# Altium footprint library UZ_CarrierBoard.PcbLib: 91 footprints (part 3 of 6)
Each footprint in its own frame and in the unit in brackets; x right, y up, seen from the top. Pads: shape width x height; smd on the part's side, far side on the other; paste and mask are expansions set on the pad; w line width, h text height; cw(c..) or ccw(c..) is an arc to the next point about the centre after c.
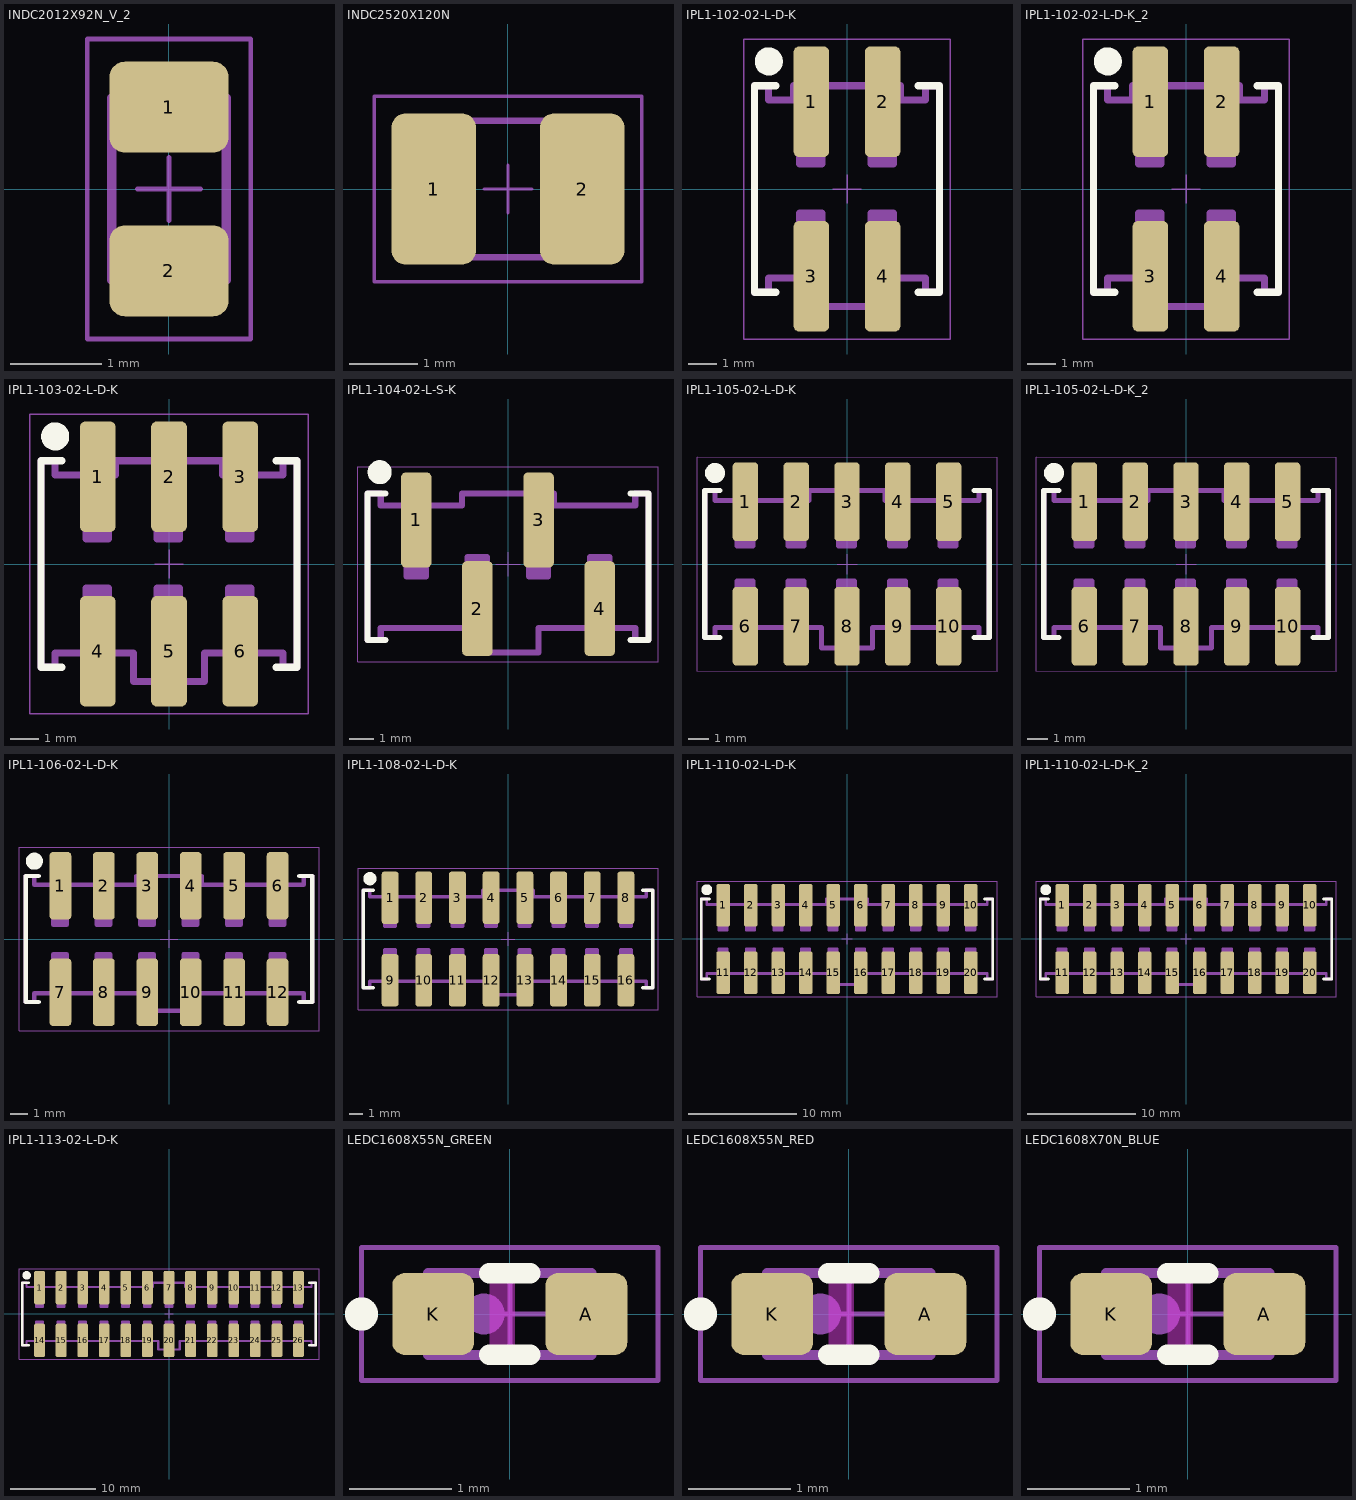
[diagram p2: the footprints below, top view; thin cyan lines are the x and y axes]

## INDC2012X92N_V_2 [mm]
pads (2):
  rrect33% 1.31x1 smd: 1(0,0.9) 2(0,-0.9)
Mechanical 13:
  lines w0.1: -0.625,-0.6 0.63,-0.6 ; -0.625,0.6 0.625,0.6 ; -0.63,-1 -0.63,1 0.63,1 0.63,-1 -0.63,-1
  text ".Designator" at 0.867,0.644 h0.7
Mechanical 15:
  lines w0.05: -0.35,0 0.35,0 ; 0,-0.35 0,0.35 ; -0.9,-1.65 -0.9,1.65 0.9,1.65 0.9,-1.65 -0.9,-1.65
3D body "742792040_Download_STP_WE-CBF-0805_rev1.stp": height 0.91, standoff 0.01, extent -0.6,-1 0.6,1

## INDC2520X120N [mm]
pads (2):
  rrect33% 1.24x2.22 smd: 1(-1.09,0) 2(1.09,0)
Mechanical 13:
  lines w0.1: -0.65,-1 -0.65,1 ; 0.65,-1 0.65,1 ; -1.25,-1 -1.25,1 1.25,1 1.25,-1 -1.25,-1
  text ".Designator" at -2.8,0.7 h1
Mechanical 15:
  lines w0.05: -0.35,0 0.35,0 ; 0,-0.35 0,0.35 ; -1.96,-1.36 -1.96,1.36 1.96,1.36 1.96,-1.36 -1.96,-1.36
3D body "LQM2HP_J0.stp": height 1.1, standoff 0, extent -1.25,-1 1.25,1

## IPL1-102-02-L-D-K [mil]
pads (4):
  rrect30% 50x155 smd mask+2: 1(-50,122.5) 2(50,122.5) 3(-50,-122.5) 4(50,-122.5)
Top Overlay:
  circle w19.68: c-109.84,179.13 r9.84
  lines w10: -100,-145 -130,-145 -130,145 -100,145 ; 100,-145 130,-145 130,145 100,145
Mechanical 13:
  rectangle: -66.53,35.03 -35.04,66.53
  rectangle: 33.46,35.04 64.95,66.53
  rectangle: -66.53,-64.96 -35.04,-33.46
  rectangle: 33.46,-64.96 64.96,-33.46
  lines w10: -130,-145 -110,-145 ; -130,-145 -130,145 ; -130,-145 -110,-145 ; -130,145 -110,145 ; -130,145 -110,145 ; -110,-145 -110,-125 ; -110,-145 -110,-125 ; -110,-125 -50,-125 -50,-165 50,-165 50,-125 110,-125 ; -110,125 -75,125 -75,145 75,145 75,125 110,125 ; -110,125 -110,145 ; -110,125 -110,145 ; 110,-145 110,-125 ; 110,-145 130,-145 ; 110,-145 110,-125 ; 110,-145 130,-145 ; 110,125 110,145 ; 110,125 110,145 ; 110,145 130,145 ; 110,145 130,145 ; 130,-145 130,145 ; -66.54,-64.96 -35.04,-64.96 -35.04,-33.46 -66.54,-33.46 -66.54,-64.96 ; -66.54,35.04 -35.04,35.04 -35.04,66.54 -66.54,66.54 -66.54,35.04 ; 33.46,-64.96 64.96,-64.96 64.96,-33.46 33.46,-33.46 33.46,-64.96 ; 33.46,35.04 64.96,35.04 64.96,66.54 33.46,66.54 33.46,35.04
  text ".Designator" at 20.87,-43.31 h39.37
  text "1" at -107.48,74.8 h27.56
  text "3" at -109.45,-108.27 h27.56
  text "4" at 80.31,-106.75 h27.56
  text "2" at 82.28,76.32 h27.56
Mechanical 15:
  lines w1.97: -19.68,0 19.69,0 ; 0,-19.69 0,19.68 ; -145.28,-210.63 145.28,-210.63 145.28,210.63 -145.28,210.63 -145.28,-210.63
3D body "IPL1-102-02-L-D-K.stp": height 345.5, standoff 0.5, extent -129.99,-188.5 130.01,188.5

## IPL1-102-02-L-D-K_2 [mil]
pads (4):
  rrect30% 50x155 smd mask+2: 1(-50,122.5) 2(50,122.5) 3(-50,-122.5) 4(50,-122.5)
Top Overlay:
  circle w19.68: c-109.84,179.13 r9.84
  lines w10: -100,-145 -130,-145 -130,145 -100,145 ; 100,-145 130,-145 130,145 100,145
Mechanical 13:
  rectangle: -66.53,35.03 -35.04,66.53
  rectangle: 33.46,35.04 64.95,66.53
  rectangle: -66.53,-64.96 -35.04,-33.46
  rectangle: 33.46,-64.96 64.96,-33.46
  lines w10: -130,-145 -110,-145 ; -130,-145 -130,145 ; -130,-145 -110,-145 ; -130,145 -110,145 ; -130,145 -110,145 ; -110,-145 -110,-125 ; -110,-145 -110,-125 ; -110,-125 -50,-125 -50,-165 50,-165 50,-125 110,-125 ; -110,125 -75,125 -75,145 75,145 75,125 110,125 ; -110,125 -110,145 ; -110,125 -110,145 ; 110,-145 110,-125 ; 110,-145 130,-145 ; 110,-145 110,-125 ; 110,-145 130,-145 ; 110,125 110,145 ; 110,125 110,145 ; 110,145 130,145 ; 110,145 130,145 ; 130,-145 130,145 ; -66.54,-64.96 -35.04,-64.96 -35.04,-33.46 -66.54,-33.46 -66.54,-64.96 ; -66.54,35.04 -35.04,35.04 -35.04,66.54 -66.54,66.54 -66.54,35.04 ; 33.46,-64.96 64.96,-64.96 64.96,-33.46 33.46,-33.46 33.46,-64.96 ; 33.46,35.04 64.96,35.04 64.96,66.54 33.46,66.54 33.46,35.04
  text ".Designator" at 17,-45.5 h39.37
  text "1" at -107.48,74.8 h27.56
  text "3" at -109.45,-108.27 h27.56
  text "4" at 80.31,-106.75 h27.56
  text "2" at 82.28,76.32 h27.56
Mechanical 15:
  lines w1.97: -19.68,0 19.69,0 ; 0,-19.69 0,19.68 ; -145.28,-210.63 145.28,-210.63 145.28,210.63 -145.28,210.63 -145.28,-210.63
3D body "IPL1-102-02-L-D-K.stp": height 345.5, standoff 0.5, extent -129.99,-188.5 130.01,188.5

## IPL1-103-02-L-D-K [mil]
pads (6):
  rrect30% 50x155 smd mask+2: 1(-100,122.5) 2(0,122.5) 3(100,122.5) 4(-100,-122.5) 5(0,-122.5) 6(100,-122.5)
Top Overlay:
  circle w19.68: c-159.84,179.13 r9.84
  lines w10: -150,-145 -180,-145 -180,145 -150,145 ; 150,-145 180,-145 180,145 150,145
Mechanical 13:
  rectangle: 83.45,-64.96 114.95,-33.46
  rectangle: 83.45,-64.96 114.95,-33.46
  rectangle: 83.45,35.04 114.95,66.54
  rectangle: 83.45,35.04 114.95,66.54
  rectangle: -16.53,-64.96 14.96,-33.46
  rectangle: -116.52,-64.96 -85.02,-33.46
  rectangle: -16.53,35.04 14.96,66.54
  rectangle: -116.52,35.04 -85.02,66.54
  lines w10: -180,-145 -160,-145 ; -180,-145 -180,145 ; -180,-145 -160,-145 ; -180,145 -160,145 ; -180,145 -160,145 ; -160,-145 -160,-125 ; -160,-145 -160,-125 ; -160,-125 -50,-125 -50,-165 50,-165 50,-125 160,-125 ; -160,125 -160,145 ; -160,125 -160,145 ; -160,125 -75,125 -75,145 75,145 75,125 160,125 ; 83.46,-64.96 83.46,-33.46 ; 83.46,-64.96 114.96,-64.96 ; 83.46,-64.96 83.46,-33.46 ; 83.46,-64.96 114.96,-64.96 ; 83.46,-33.46 114.96,-33.46 ; 83.46,-33.46 114.96,-33.46 ; 83.46,35.04 83.46,66.54 ; 83.46,35.04 114.96,35.04 ; 83.46,35.04 83.46,66.54 ; 83.46,35.04 114.96,35.04 ; 83.46,66.54 114.96,66.54 ; 83.46,66.54 114.96,66.54 ; 114.96,-64.96 114.96,-33.46 ; 114.96,-64.96 114.96,-33.46 ; 114.96,35.04 114.96,66.54 ; 114.96,35.04 114.96,66.54 ; 160,-145 180,-145 ; 160,-145 160,-125 ; 160,-145 180,-145 ; 160,-145 160,-125 ; 160,125 160,145 ; 160,125 160,145 ; 160,145 180,145 ; 160,145 180,145 ; 180,-145 180,145 ; -116.54,-64.96 -116.54,-33.46 -85.04,-33.46 -85.04,-64.96 -116.54,-64.96 ; -116.54,35.04 -116.54,66.54 -85.04,66.54 -85.04,35.04 -116.54,35.04 ; -16.54,-64.96 -16.54,-33.46 14.96,-33.46 14.96,-64.96 -16.54,-64.96 ; -16.54,35.04 -16.54,66.54 14.96,66.54 14.96,35.04 -16.54,35.04
  text "4" at -159.45,-108.27 h27.56
  text "1" at -157.48,74.8 h27.56
  text ".Designator" at 62.99,19.69 h39.37
  text "6" at 147.24,-106.75 h27.56
  text "3" at 149.21,76.32 h27.56
Mechanical 15:
  lines w1.97: -19.68,0 19.69,0 ; 0,-19.69 0,19.68 ; -195.28,-210.63 195.28,-210.63 195.28,210.63 -195.28,210.63 -195.28,-210.63
3D body "IPL1-103-02-L-D-K.stp": height 345.5, standoff 0.5, extent -179.99,-188.5 180.01,188.5

## IPL1-104-02-L-S-K [mm]
pads (4):
  rrect30% 1.27x3.94 smd mask+0.051: 1(-3.81,1.84) 2(-1.27,-1.84) 3(1.27,1.84) 4(3.81,-1.84)
Top Overlay:
  circle w0.5: c-5.33,3.825 r0.25
  lines w0.254: -5.08,-3.148 -5.842,-3.148 -5.842,2.948 -5.08,2.948 ; 5.08,-3.148 5.842,-3.148 5.842,2.948 5.08,2.948
Mechanical 13:
  rectangle: 3.405,-0.4 4.205,0.4
  rectangle: 0.865,-0.4 1.665,0.4
  rectangle: -1.675,-0.4 -0.875,0.4
  rectangle: -4.215,-0.4 -3.415,0.4
  lines w0.254: -5.842,-3.148 -5.283,-3.148 -5.283,-2.64 -1.27,-2.64 -1.27,-3.656 1.27,-3.656 1.27,-2.64 5.283,-2.64 5.283,-3.148 5.842,-3.148 5.842,2.948 5.283,2.948 5.283,2.44 1.905,2.44 1.905,2.948 -1.905,2.948 -1.905,2.44 -5.283,2.44 -5.283,2.948 -5.842,2.948 -5.842,-3.148 ; -4.215,-0.5 -4.215,0.3 -3.415,0.3 -3.415,-0.5 -4.215,-0.5 ; -1.675,-0.5 -1.675,0.3 -0.875,0.3 -0.875,-0.5 -1.675,-0.5 ; 0.865,-0.5 0.865,0.3 1.665,0.3 1.665,-0.5 0.865,-0.5 ; 3.405,-0.5 3.405,0.3 4.205,0.3 4.205,-0.5 3.405,-0.5
  text "4" at 4.136,-0.755 h1
  text "1" at -3.646,-0.781 h1
  text ".Designator" at 1.343,2.043 h1
Mechanical 15:
  lines w0.05: -0.5,0 0.5,0 ; 0,-0.5 0,0.5 ; -6.23,-4.05 6.23,-4.05 6.23,4.05 -6.23,4.05 -6.23,-4.05
3D body "IPL1-104-02-L-S-K.stp": height 8.76, standoff 0, extent -5.842,-3.669 5.842,3.647

## IPL1-105-02-L-D-K [mil]
pads (10):
  rrect30% 50x155 smd mask+2: 1(-200,122.5) 2(-100,122.5) 3(0,122.5) 4(100,122.5) 5(200,122.5) 6(-200,-122.5) 7(-100,-122.5) 8(0,-122.5) 9(100,-122.5) 10(200,-122.5)
Top Overlay:
  circle w19.68: c-259.84,179.13 r9.84
  lines w10: -250,-145 -280,-145 -280,145 -250,145 ; 250,-145 280,-145 280,145 250,145
Mechanical 13:
  rectangle: -216.51,35.04 -185.01,66.54
  rectangle: -116.51,35.04 -85.01,66.54
  rectangle: -16.54,35.02 14.96,66.52
  rectangle: 83.43,35.03 114.93,66.53
  rectangle: 183.43,35.03 214.93,66.53
  rectangle: -216.5,-64.95 -185.01,-33.46
  rectangle: -116.5,-64.95 -85.01,-33.46
  rectangle: -16.53,-64.94 14.96,-33.44
  rectangle: 83.44,-64.96 114.94,-33.46
  rectangle: 183.44,-64.96 214.94,-33.46
  lines w10: -280,-145 -260,-145 ; -280,-145 -280,145 ; -280,-145 -260,-145 ; -280,145 -260,145 ; -280,145 -260,145 ; -260,-145 -260,-125 ; -260,-145 -260,-125 ; -260,-125 -50,-125 -50,-165 50,-165 50,-125 260,-125 ; -260,125 -75,125 -75,145 75,145 75,125 260,125 ; -260,125 -260,145 ; -260,125 -260,145 ; 260,-145 260,-125 ; 260,-145 280,-145 ; 260,-145 260,-125 ; 260,-145 280,-145 ; 260,125 260,145 ; 260,125 260,145 ; 260,145 280,145 ; 260,145 280,145 ; 280,-145 280,145 ; -216.54,-64.96 -185.04,-64.96 -185.04,-33.46 -216.54,-33.46 -216.54,-64.96 ; -216.54,35.04 -185.04,35.04 -185.04,66.54 -216.54,66.54 -216.54,35.04 ; -116.54,-64.96 -85.04,-64.96 -85.04,-33.46 -116.54,-33.46 -116.54,-64.96 ; -116.54,35.04 -85.04,35.04 -85.04,66.54 -116.54,66.54 -116.54,35.04 ; -16.54,-64.96 14.96,-64.96 14.96,-33.46 -16.54,-33.46 -16.54,-64.96 ; -16.54,35.04 14.96,35.04 14.96,66.54 -16.54,66.54 -16.54,35.04 ; 83.46,-64.96 114.96,-64.96 114.96,-33.46 83.46,-33.46 83.46,-64.96 ; 83.46,35.04 114.96,35.04 114.96,66.54 83.46,66.54 83.46,35.04 ; 183.46,-64.96 214.96,-64.96 214.96,-33.46 183.46,-33.46 183.46,-64.96 ; 183.46,35.04 214.96,35.04 214.96,66.54 183.46,66.54 183.46,35.04
  text "6" at -259.45,-108.27 h27.56
  text "10" at 216.54,-108.27 h27.56
  text "5" at 236.22,74.8 h27.56
  text "1" at -257.48,74.8 h27.56
  text ".Designator" at -25.94,-68.85 h39.37
Mechanical 15:
  lines w1.97: -19.68,0 19.69,0 ; 0,-19.69 0,19.68 ; -295.28,-210.63 295.28,-210.63 295.28,210.63 -295.28,210.63 -295.28,-210.63
3D body "IPL1-105-02-L-D-K.stp": height 345.5, standoff 0.5, extent -280,-188.5 280,188.5

## IPL1-105-02-L-D-K_2 [mil]
pads (10):
  rrect30% 50x155 smd mask+2: 1(-200,122.5) 2(-100,122.5) 3(0,122.5) 4(100,122.5) 5(200,122.5) 6(-200,-122.5) 7(-100,-122.5) 8(0,-122.5) 9(100,-122.5) 10(200,-122.5)
Top Overlay:
  circle w19.68: c-259.84,179.13 r9.84
  lines w10: -250,-145 -280,-145 -280,145 -250,145 ; 250,-145 280,-145 280,145 250,145
Mechanical 13:
  rectangle: -216.53,35.03 -185.04,66.53
  rectangle: -116.53,35.03 -85.04,66.53
  rectangle: -16.55,35.04 14.95,66.54
  rectangle: 83.46,35.04 114.95,66.53
  rectangle: 183.46,35.04 214.95,66.53
  rectangle: -216.53,-64.96 -185.04,-33.46
  rectangle: -116.53,-64.96 -85.04,-33.46
  rectangle: -16.55,-64.96 14.95,-33.46
  rectangle: 83.46,-64.96 114.96,-33.46
  rectangle: 183.46,-64.96 214.96,-33.46
  lines w10: -280,-145 -260,-145 ; -280,-145 -280,145 ; -280,-145 -260,-145 ; -280,145 -260,145 ; -280,145 -260,145 ; -260,-145 -260,-125 ; -260,-145 -260,-125 ; -260,-125 -50,-125 -50,-165 50,-165 50,-125 260,-125 ; -260,125 -75,125 -75,145 75,145 75,125 260,125 ; -260,125 -260,145 ; -260,125 -260,145 ; 260,-145 260,-125 ; 260,-145 280,-145 ; 260,-145 260,-125 ; 260,-145 280,-145 ; 260,125 260,145 ; 260,125 260,145 ; 260,145 280,145 ; 260,145 280,145 ; 280,-145 280,145 ; -216.54,-64.96 -185.04,-64.96 -185.04,-33.46 -216.54,-33.46 -216.54,-64.96 ; -216.54,35.04 -185.04,35.04 -185.04,66.54 -216.54,66.54 -216.54,35.04 ; -116.54,-64.96 -85.04,-64.96 -85.04,-33.46 -116.54,-33.46 -116.54,-64.96 ; -116.54,35.04 -85.04,35.04 -85.04,66.54 -116.54,66.54 -116.54,35.04 ; -16.54,-64.96 14.96,-64.96 14.96,-33.46 -16.54,-33.46 -16.54,-64.96 ; -16.54,35.04 14.96,35.04 14.96,66.54 -16.54,66.54 -16.54,35.04 ; 83.46,-64.96 114.96,-64.96 114.96,-33.46 83.46,-33.46 83.46,-64.96 ; 83.46,35.04 114.96,35.04 114.96,66.54 83.46,66.54 83.46,35.04 ; 183.46,-64.96 214.96,-64.96 214.96,-33.46 183.46,-33.46 183.46,-64.96 ; 183.46,35.04 214.96,35.04 214.96,66.54 183.46,66.54 183.46,35.04
  text ".Designator" at -28.74,-45.08 h39.37
  text "1" at -257.48,74.8 h27.56
  text "5" at 236.22,74.8 h27.56
  text "10" at 216.54,-108.27 h27.56
  text "6" at -259.45,-108.27 h27.56
Mechanical 15:
  lines w1.97: -19.68,0 19.69,0 ; 0,-19.69 0,19.68 ; -295.28,-210.63 295.28,-210.63 295.28,210.63 -295.28,210.63 -295.28,-210.63
3D body "IPL1-105-02-L-D-K.stp": height 345.5, standoff 0.5, extent -279.99,-188.5 280.01,188.5

## IPL1-106-02-L-D-K [mil]
pads (12):
  rrect30% 50x155 smd mask+2: 1(-250,122.5) 2(-150,122.5) 3(-50,122.5) 4(50,122.5) 5(150,122.5) 6(250,122.5) 7(-250,-122.5) 8(-150,-122.5) 9(-50,-122.5) 10(50,-122.5) 11(150,-122.5) 12(250,-122.5)
Top Overlay:
  circle w19.68: c-309.84,179.13 r9.84
  lines w10: -300,-145 -330,-145 -330,145 -300,145 ; 300,-145 330,-145 330,145 300,145
Mechanical 13:
  rectangle: 233.46,-66.92 264.96,-35.43
  rectangle: 133.46,-66.92 164.96,-35.43
  rectangle: 33.46,-66.92 64.96,-35.43
  rectangle: -66.53,-66.92 -35.03,-35.43
  rectangle: -166.53,-66.92 -135.03,-35.43
  rectangle: -266.53,-66.92 -235.03,-35.43
  rectangle: 233.46,33.07 264.96,64.56
  rectangle: 133.46,33.07 164.96,64.56
  rectangle: 33.46,33.07 64.96,64.56
  rectangle: -66.53,33.07 -35.03,64.56
  rectangle: -166.53,33.07 -135.03,64.56
  rectangle: -266.53,33.07 -235.03,64.56
  lines w10: -330,-145 -310,-145 ; -330,-145 -330,145 ; -330,-145 -310,-145 ; -330,-145 -330,145 ; -330,145 -310,145 ; -330,145 -310,145 ; -310,-145 -310,-125 ; -310,-145 -310,-125 ; -310,-125 -50,-125 ; -310,-125 -50,-125 ; -310,125 -310,145 ; -310,125 -75,125 ; -310,125 -310,145 ; -310,125 -75,125 ; -75,125 -75,145 ; -75,125 -75,145 ; -75,145 75,145 ; -75,145 75,145 ; -50,-165 50,-165 ; -50,-165 -50,-125 ; -50,-165 50,-165 ; -50,-165 -50,-125 ; 50,-165 50,-125 ; 50,-165 50,-125 ; 50,-125 310,-125 ; 50,-125 310,-125 ; 75,125 75,145 ; 75,125 310,125 ; 75,125 75,145 ; 75,125 310,125 ; 310,-145 310,-125 ; 310,-145 310,-125 ; 310,-145 330,-145 ; 310,-145 330,-145 ; 310,125 310,145 ; 310,125 310,145 ; 310,145 330,145 ; 310,145 330,145 ; 330,-145 330,145 ; 330,-145 330,145 ; -266.54,-66.93 -266.54,-35.43 -235.04,-35.43 -235.04,-66.93 -266.54,-66.93 ; -266.54,33.07 -266.54,64.57 -235.04,64.57 -235.04,33.07 -266.54,33.07 ; -166.54,-66.93 -166.54,-35.43 -135.04,-35.43 -135.04,-66.93 -166.54,-66.93 ; -166.54,33.07 -166.54,64.57 -135.04,64.57 -135.04,33.07 -166.54,33.07 ; -66.54,-66.93 -66.54,-35.43 -35.04,-35.43 -35.04,-66.93 -66.54,-66.93 ; -66.54,33.07 -66.54,64.57 -35.04,64.57 -35.04,33.07 -66.54,33.07 ; 33.46,-66.93 33.46,-35.43 64.96,-35.43 64.96,-66.93 33.46,-66.93 ; 33.46,33.07 33.46,64.57 64.96,64.57 64.96,33.07 33.46,33.07 ; 133.46,-66.93 133.46,-35.43 164.96,-35.43 164.96,-66.93 133.46,-66.93 ; 133.46,33.07 133.46,64.57 164.96,64.57 164.96,33.07 133.46,33.07 ; 233.46,-66.93 233.46,-35.43 264.96,-35.43 264.96,-66.93 233.46,-66.93 ; 233.46,33.07 233.46,64.57 264.96,64.57 264.96,33.07 233.46,33.07
  text "7" at -303.15,-108.27 h27.56
  text "12" at 269.69,-108.27 h27.56
  text "6" at 285.43,72.83 h27.56
  text "1" at -299.21,72.83 h27.56
  text ".Designator" at -19.68,51.15 h39.37
Mechanical 15:
  lines w1.97: -19.68,0 19.69,0 ; 0,-19.69 0,19.68 ; -345.28,-210.63 345.28,-210.63 345.28,210.63 -345.28,210.63 -345.28,-210.63
3D body "IPL1-106-02-L-D-K.stp": height 320, standoff -25, extent -330,-188.5 330,188.5

## IPL1-108-02-L-D-K [mil]
pads (16):
  rrect30% 50x155 smd mask+2: 1(-350,122.5) 2(-250,122.5) 3(-150,122.5) 4(-50,122.5) 5(50,122.5) 6(150,122.5) 7(250,122.5) 8(350,122.5) 9(-350,-122.5) 10(-250,-122.5) 11(-150,-122.5) 12(-50,-122.5) 13(50,-122.5) 14(150,-122.5) 15(250,-122.5) 16(350,-122.5)
Top Overlay:
  circle w19.68: c-409.84,179.13 r9.84
  lines w10: -400,-145 -430,-145 -430,145 -400,145 ; 400,-145 430,-145 430,145 400,145
Mechanical 13:
  rectangle: -366.12,37.01 -334.62,68.5
  rectangle: -266.12,37.01 -234.62,68.5
  rectangle: -166.12,37.01 -134.62,68.5
  rectangle: -66.12,37.01 -34.62,68.5
  rectangle: 33.83,37.01 65.33,68.5
  rectangle: 133.83,37.01 165.33,68.5
  rectangle: 233.83,37.01 265.33,68.5
  rectangle: 333.83,37.01 365.33,68.5
  rectangle: -366.12,-62.99 -334.62,-31.5
  rectangle: -266.12,-62.99 -234.62,-31.5
  rectangle: -166.12,-62.99 -134.62,-31.5
  rectangle: -66.12,-62.99 -34.62,-31.5
  rectangle: 33.83,-62.99 65.33,-31.5
  rectangle: 133.83,-62.99 165.33,-31.5
  rectangle: 233.83,-62.99 265.33,-31.5
  rectangle: 333.83,-62.99 365.33,-31.5
  lines w10: -10,-165 50,-165 ; 50,-165 50,-125 410,-125 410,-145 430,-145 430,145 410,145 410,125 75,125 75,145 -75,145 -75,125 -410,125 -410,145 -430,145 -430,-145 -410,-145 -410,-125 -50,-125 -50,-165 50,-165 ; -366.14,-62.99 -334.65,-62.99 -334.65,-31.5 -366.14,-31.5 -366.14,-62.99 ; -366.14,37.01 -334.65,37.01 -334.65,68.5 -366.14,68.5 -366.14,37.01 ; -266.14,-62.99 -234.65,-62.99 -234.65,-31.5 -266.14,-31.5 -266.14,-62.99 ; -266.14,37.01 -234.65,37.01 -234.65,68.5 -266.14,68.5 -266.14,37.01 ; -166.14,-62.99 -134.65,-62.99 -134.65,-31.5 -166.14,-31.5 -166.14,-62.99 ; -166.14,37.01 -134.65,37.01 -134.65,68.5 -166.14,68.5 -166.14,37.01 ; -66.14,-62.99 -34.65,-62.99 -34.65,-31.5 -66.14,-31.5 -66.14,-62.99 ; -66.14,37.01 -34.65,37.01 -34.65,68.5 -66.14,68.5 -66.14,37.01 ; 33.86,-62.99 65.35,-62.99 65.35,-31.5 33.86,-31.5 33.86,-62.99 ; 33.86,37.01 65.35,37.01 65.35,68.5 33.86,68.5 33.86,37.01 ; 133.86,-62.99 165.35,-62.99 165.35,-31.5 133.86,-31.5 133.86,-62.99 ; 133.86,37.01 165.35,37.01 165.35,68.5 133.86,68.5 133.86,37.01 ; 233.86,-62.99 265.35,-62.99 265.35,-31.5 233.86,-31.5 233.86,-62.99 ; 233.86,37.01 265.35,37.01 265.35,68.5 233.86,68.5 233.86,37.01 ; 333.86,-62.99 365.35,-62.99 365.35,-31.5 333.86,-31.5 333.86,-62.99 ; 333.86,37.01 365.35,37.01 365.35,68.5 333.86,68.5 333.86,37.01
  text ".Designator" at 37.4,20.14 h39.37
  text "1" at -396.06,59.06 h27.56
  text "8" at 387.8,55.12 h27.56
  text "16" at 370.08,-104.33 h27.56
  text "11" at -409.84,-100.39 h27.56
Mechanical 15:
  lines w1.97: -19.68,0 19.69,0 ; 0,-19.69 0,19.68 ; -445.28,-210.63 -445.28,210.63 445.28,210.63 445.28,-210.63 -445.28,-210.63
3D body "IPL1-108-02-L-D-K.stp": height 345, standoff 0, extent -430,-188.5 430,188.5

## IPL1-110-02-L-D-K [mil]
pads (20):
  rrect30% 50x155 smd mask+2: 1(-450,122.5) 2(-350,122.5) 3(-250,122.5) 4(-150,122.5) 5(-50,122.5) 6(50,122.5) 7(150,122.5) 8(250,122.5) 9(350,122.5) 10(450,122.5) 11(-450,-122.5) 12(-350,-122.5) 13(-250,-122.5) 14(-150,-122.5) 15(-50,-122.5) 16(50,-122.5) 17(150,-122.5) 18(250,-122.5) 19(350,-122.5) 20(450,-122.5)
Top Overlay:
  circle w19.68: c-509.84,179.13 r9.84
  lines w10: -500,-145 -530,-145 -530,145 -500,145 ; 500,-145 530,-145 530,145 500,145
Mechanical 13:
  rectangle: -466.54,33.07 -435.04,64.57
  rectangle: -366.54,33.07 -335.04,64.57
  rectangle: -266.54,33.07 -235.04,64.57
  rectangle: -166.54,33.07 -135.04,64.57
  rectangle: -66.54,33.07 -35.04,64.57
  rectangle: 33.46,33.07 64.96,64.57
  rectangle: 133.46,33.07 164.96,64.57
  rectangle: 233.46,33.07 264.96,64.57
  rectangle: -466.54,-66.93 -435.04,-35.43
  rectangle: -366.54,-66.93 -335.04,-35.43
  rectangle: -266.54,-66.93 -235.04,-35.43
  rectangle: -166.54,-66.93 -135.04,-35.43
  rectangle: -66.54,-66.93 -35.04,-35.43
  rectangle: 33.46,-66.93 64.96,-35.43
  rectangle: 133.46,-66.93 164.96,-35.43
  rectangle: 233.46,-66.93 264.96,-35.43
  rectangle: 433.46,-66.93 464.96,-35.43
  rectangle: 333.46,-66.93 364.96,-35.43
  rectangle: 433.46,33.07 464.96,64.57
  rectangle: 333.46,33.07 364.96,64.57
  lines w10: -530,-145 -530,145 -510,145 -510,125 -75,125 -75,145 75,145 75,125 510,125 510,145 530,145 530,-145 510,-145 510,-125 50,-125 50,-165 -50,-165 -50,-125 -510,-125 -510,-145 -530,-145 ; -466.54,-66.93 -435.04,-66.93 -435.04,-35.43 -466.54,-35.43 -466.54,-66.93 ; -466.54,33.07 -435.04,33.07 -435.04,64.57 -466.54,64.57 -466.54,33.07 ; -366.54,-66.93 -335.04,-66.93 -335.04,-35.43 -366.54,-35.43 -366.54,-66.93 ; -366.54,33.07 -335.04,33.07 -335.04,64.57 -366.54,64.57 -366.54,33.07 ; -266.54,-66.93 -235.04,-66.93 -235.04,-35.43 -266.54,-35.43 -266.54,-66.93 ; -266.54,33.07 -235.04,33.07 -235.04,64.57 -266.54,64.57 -266.54,33.07 ; -166.54,-66.93 -135.04,-66.93 -135.04,-35.43 -166.54,-35.43 -166.54,-66.93 ; -166.54,33.07 -135.04,33.07 -135.04,64.57 -166.54,64.57 -166.54,33.07 ; -66.54,-66.93 -35.04,-66.93 -35.04,-35.43 -66.54,-35.43 -66.54,-66.93 ; -66.54,33.07 -35.04,33.07 -35.04,64.57 -66.54,64.57 -66.54,33.07 ; 33.46,-66.93 64.96,-66.93 64.96,-35.43 33.46,-35.43 33.46,-66.93 ; 33.46,33.07 64.96,33.07 64.96,64.57 33.46,64.57 33.46,33.07 ; 133.46,-66.93 164.96,-66.93 164.96,-35.43 133.46,-35.43 133.46,-66.93 ; 133.46,33.07 164.96,33.07 164.96,64.57 133.46,64.57 133.46,33.07 ; 233.46,-66.93 264.96,-66.93 264.96,-35.43 233.46,-35.43 233.46,-66.93 ; 233.46,33.07 264.96,33.07 264.96,64.57 233.46,64.57 233.46,33.07 ; 333.46,-66.93 333.46,-35.43 364.96,-35.43 364.96,-66.93 333.46,-66.93 ; 333.46,33.07 333.46,64.57 364.96,64.57 364.96,33.07 333.46,33.07 ; 433.46,-66.93 433.46,-35.43 464.96,-35.43 464.96,-66.93 433.46,-66.93 ; 433.46,33.07 433.46,64.57 464.96,64.57 464.96,33.07 433.46,33.07
  text "11" at -509.84,-110.24 h27.56
  text "20" at 464.57,-110.24 h27.56
  text "10" at 470.47,78.74 h27.56
  text "1" at -496.06,78.74 h27.56
  text ".Designator" at -31.5,-17.72 h39.37
Mechanical 15:
  lines w1.97: -19.68,0 19.69,0 ; 0,-19.69 0,19.68 ; -545.28,-210.63 545.28,-210.63 545.28,210.63 -545.28,210.63 -545.28,-210.63
3D body "IPL1-110-02-F-D-K.stp": height 345, standoff 0, extent -530,-188.49 530,188.51

## IPL1-110-02-L-D-K_2 [mil]
pads (20):
  rrect30% 50x155 smd mask+2: 1(-450,122.5) 2(-350,122.5) 3(-250,122.5) 4(-150,122.5) 5(-50,122.5) 6(50,122.5) 7(150,122.5) 8(250,122.5) 9(350,122.5) 10(450,122.5) 11(-450,-122.5) 12(-350,-122.5) 13(-250,-122.5) 14(-150,-122.5) 15(-50,-122.5) 16(50,-122.5) 17(150,-122.5) 18(250,-122.5) 19(350,-122.5) 20(450,-122.5)
Top Overlay:
  circle w19.68: c-509.84,179.13 r9.84
  lines w10: -500,-145 -530,-145 -530,145 -500,145 ; 500,-145 530,-145 530,145 500,145
Mechanical 13:
  rectangle: 333.46,33.07 364.96,64.57
  rectangle: 433.46,33.07 464.96,64.57
  rectangle: 333.46,-66.92 364.96,-35.43
  rectangle: 433.46,-66.92 464.96,-35.43
  rectangle: 233.46,-66.92 264.96,-35.43
  rectangle: 133.46,-66.92 164.96,-35.43
  rectangle: 33.46,-66.92 64.96,-35.43
  rectangle: -66.53,-66.92 -35.03,-35.43
  rectangle: -166.53,-66.92 -135.03,-35.43
  rectangle: -266.53,-66.92 -235.03,-35.43
  rectangle: -366.53,-66.92 -335.03,-35.43
  rectangle: -466.53,-66.92 -435.03,-35.43
  rectangle: 233.46,33.07 264.96,64.57
  rectangle: 133.46,33.07 164.96,64.57
  rectangle: 33.46,33.07 64.96,64.57
  rectangle: -66.53,33.07 -35.03,64.56
  rectangle: -166.53,33.07 -135.03,64.56
  rectangle: -266.53,33.07 -235.03,64.56
  rectangle: -366.53,33.07 -335.03,64.56
  rectangle: -466.53,33.07 -435.03,64.56
  lines w10: -530,-145 -510,-145 -510,-125 -50,-125 -50,-165 50,-165 50,-125 510,-125 510,-145 530,-145 530,145 510,145 510,125 75,125 75,145 -75,145 -75,125 -510,125 -510,145 -530,145 -530,-145 ; -466.54,-66.93 -466.54,-35.43 -435.04,-35.43 -435.04,-66.93 -466.54,-66.93 ; -466.54,33.07 -466.54,64.57 -435.04,64.57 -435.04,33.07 -466.54,33.07 ; -366.54,-66.93 -366.54,-35.43 -335.04,-35.43 -335.04,-66.93 -366.54,-66.93 ; -366.54,33.07 -366.54,64.57 -335.04,64.57 -335.04,33.07 -366.54,33.07 ; -266.54,-66.93 -266.54,-35.43 -235.04,-35.43 -235.04,-66.93 -266.54,-66.93 ; -266.54,33.07 -266.54,64.57 -235.04,64.57 -235.04,33.07 -266.54,33.07 ; -166.54,-66.93 -166.54,-35.43 -135.04,-35.43 -135.04,-66.93 -166.54,-66.93 ; -166.54,33.07 -166.54,64.57 -135.04,64.57 -135.04,33.07 -166.54,33.07 ; -66.54,-66.93 -66.54,-35.43 -35.04,-35.43 -35.04,-66.93 -66.54,-66.93 ; -66.54,33.07 -66.54,64.57 -35.04,64.57 -35.04,33.07 -66.54,33.07 ; 33.46,-66.93 33.46,-35.43 64.96,-35.43 64.96,-66.93 33.46,-66.93 ; 33.46,33.07 33.46,64.57 64.96,64.57 64.96,33.07 33.46,33.07 ; 133.46,-66.93 133.46,-35.43 164.96,-35.43 164.96,-66.93 133.46,-66.93 ; 133.46,33.07 133.46,64.57 164.96,64.57 164.96,33.07 133.46,33.07 ; 233.46,-66.93 233.46,-35.43 264.96,-35.43 264.96,-66.93 233.46,-66.93 ; 233.46,33.07 233.46,64.57 264.96,64.57 264.96,33.07 233.46,33.07 ; 333.46,-66.93 364.96,-66.93 364.96,-35.43 333.46,-35.43 333.46,-66.93 ; 333.46,33.07 364.96,33.07 364.96,64.57 333.46,64.57 333.46,33.07 ; 433.46,-66.93 464.96,-66.93 464.96,-35.43 433.46,-35.43 433.46,-66.93 ; 433.46,33.07 464.96,33.07 464.96,64.57 433.46,64.57 433.46,33.07
  text "11" at -509.84,-110.24 h27.56
  text "20" at 464.57,-110.24 h27.56
  text "10" at 470.47,78.74 h27.56
  text "1" at -496.06,78.74 h27.56
  text ".Designator" at 19.29,-47.7 h39.37
Mechanical 15:
  lines w1.97: -19.68,0 19.69,0 ; 0,-19.69 0,19.68 ; -545.28,-210.63 -545.28,210.63 545.28,210.63 545.28,-210.63 -545.28,-210.63
3D body "IPL1-110-02-F-D-K.stp": height 345, standoff 0, extent -530,-188.49 530,188.51

## IPL1-113-02-L-D-K [mil]
pads (26):
  rrect30% 50x155 smd mask+2: 1(-600,122.5) 2(-500,122.5) 3(-400,122.5) 4(-300,122.5) 5(-200,122.5) 6(-100,122.5) 7(0,122.5) 8(100,122.5) 9(200,122.5) 10(300,122.5) 11(400,122.5) 12(500,122.5) 13(600,122.5) 14(-600,-122.5) 15(-500,-122.5) 16(-400,-122.5) 17(-300,-122.5) 18(-200,-122.5) 19(-100,-122.5) 20(0,-122.5) 21(100,-122.5) 22(200,-122.5) 23(300,-122.5) 24(400,-122.5) 25(500,-122.5) 26(600,-122.5)
Top Overlay:
  circle w19.68: c-659.84,179.13 r9.84
  lines w10: -650,-145 -680,-145 -680,145 -650,145 ; 650,-145 680,-145 680,145 650,145
Mechanical 13:
  drawing of 151 lines, arcs and shapes, not listed
  text "26" at 614.57,-110.24 h27.56
  text "13" at 620.47,78.74 h27.56
  text "14" at -659.84,-110.24 h27.56
  text "1" at -646.06,78.74 h27.56
  text ".Designator" at -33.68,-47.24 h39.37
Mechanical 15:
  lines w1.97: -19.68,0 19.69,0 ; 0,-19.69 0,19.68 ; -695.28,-210.63 695.28,-210.63 695.28,210.63 -695.28,210.63 -695.28,-210.63
3D body "IPL1-113-02-L-D-K.stp": height 345, standoff 0, extent -680,-188.5 680,188.5

## LEDC1608X55N_GREEN [mm]
pads (2):
  rrect30% 0.8x0.8 smd: A(0.75,0) K(-0.75,0)
Top Layer keep-out:
  rectangle: -0.2,-0.35 0.05,0.35
Top Overlay:
  circle w0.254: c-1.45,0 r0.035
  lines w0.2: -0.2,-0.4 0.2,-0.4 ; -0.2,0.4 0.2,0.4
Mechanical 13:
  circle w0.2: c-0.25,0 r0.1
  lines w0.1: -0.55,-0.4 -0.55,0.4 ; 0.55,-0.4 0.55,0.4 ; -0.8,-0.4 0.8,-0.4 0.8,0.4 -0.8,0.4 -0.8,-0.4
  text "A" at 1.475,-0.35 h0.7
  text ".Designator" at 0.9,-0.601 h0.7
  text "K" at -1.425,-0.35 h0.7
Mechanical 15:
  lines w0.05: -0.45,0 0.45,0 ; 0,-0.45 0,0.45 ; -1.45,-0.65 1.45,-0.65 1.45,0.65 -1.45,0.65 -1.45,-0.65
3D body: height 0.56, standoff 0.25, extent -0.575,-0.41 0.575,0.41
3D body "19-213.STEP": height 0.56, standoff -0.01, extent -0.83,-0.4 0.83,0.4

## LEDC1608X55N_RED [mm]
pads (2):
  rrect30% 0.8x0.8 smd: A(0.75,0) K(-0.75,0)
Top Layer keep-out:
  rectangle: -0.2,-0.35 0.05,0.35
Top Overlay:
  circle w0.254: c-1.45,0 r0.035
  lines w0.2: -0.2,-0.4 0.2,-0.4 ; -0.2,0.4 0.2,0.4
Mechanical 13:
  circle w0.2: c-0.275,0 r0.1
  lines w0.1: -0.55,-0.4 -0.55,0.4 ; 0.55,-0.4 0.55,0.4 ; -0.8,-0.4 -0.8,0.4 0.8,0.4 0.8,-0.4 -0.8,-0.4
  text "A" at 1.475,-0.35 h0.7
  text ".Designator" at 1.208,-0.641 h0.7
  text "K" at -1.425,-0.35 h0.7
Mechanical 15:
  lines w0.05: -0.45,0 0.45,0 ; 0,-0.45 0,0.45 ; -1.45,-0.65 -1.45,0.65 1.45,0.65 1.45,-0.65 -1.45,-0.65
3D body: height 0.56, standoff 0.25, extent -0.575,-0.41 0.575,0.41
3D body "19-213.STEP": height 0.56, standoff -0.01, extent -0.83,-0.4 0.83,0.4

## LEDC1608X70N_BLUE [mm]
pads (2):
  rrect30% 0.8x0.8 smd: A(0.75,0) K(-0.75,0)
Top Layer keep-out:
  rectangle: -0.2,-0.35 0.05,0.35
Top Overlay:
  circle w0.254: c-1.45,0 r0.035
  lines w0.2: -0.2,-0.4 0.2,-0.4 ; -0.2,0.4 0.2,0.4
Mechanical 13:
  circle w0.2: c-0.275,0 r0.1
  lines w0.1: -0.55,-0.4 -0.55,0.4 ; 0.55,-0.4 0.55,0.4 ; -0.8,-0.4 0.8,-0.4 0.8,0.4 -0.8,0.4 -0.8,-0.4
  text "K" at -1.425,-0.35 h0.7
  text ".Designator" at 1.25,-0.541 h0.7
  text "A" at 1.475,-0.35 h0.7
Mechanical 15:
  lines w0.05: -0.45,0 0.45,0 ; 0,-0.45 0,0.45 ; -1.45,-0.65 1.45,-0.65 1.45,0.65 -1.45,0.65 -1.45,-0.65
3D body "STP_150060xS75000_blue.STEP": height 0.7, standoff 0, extent -0.8,-0.4 0.8,0.4